# Altium footprint library WR-TBL_Pluggable PCB Header.PcbLib: 719 footprints (part 7 of 45)
Each footprint in its own frame and in the unit in brackets; x right, y up, seen from the top. Pads: shape width x height; smd on the part's side, far side on the other; paste and mask are expansions set on the pad; w line width, h text height; cw(c..) or ccw(c..) is an arc to the next point about the centre after c.
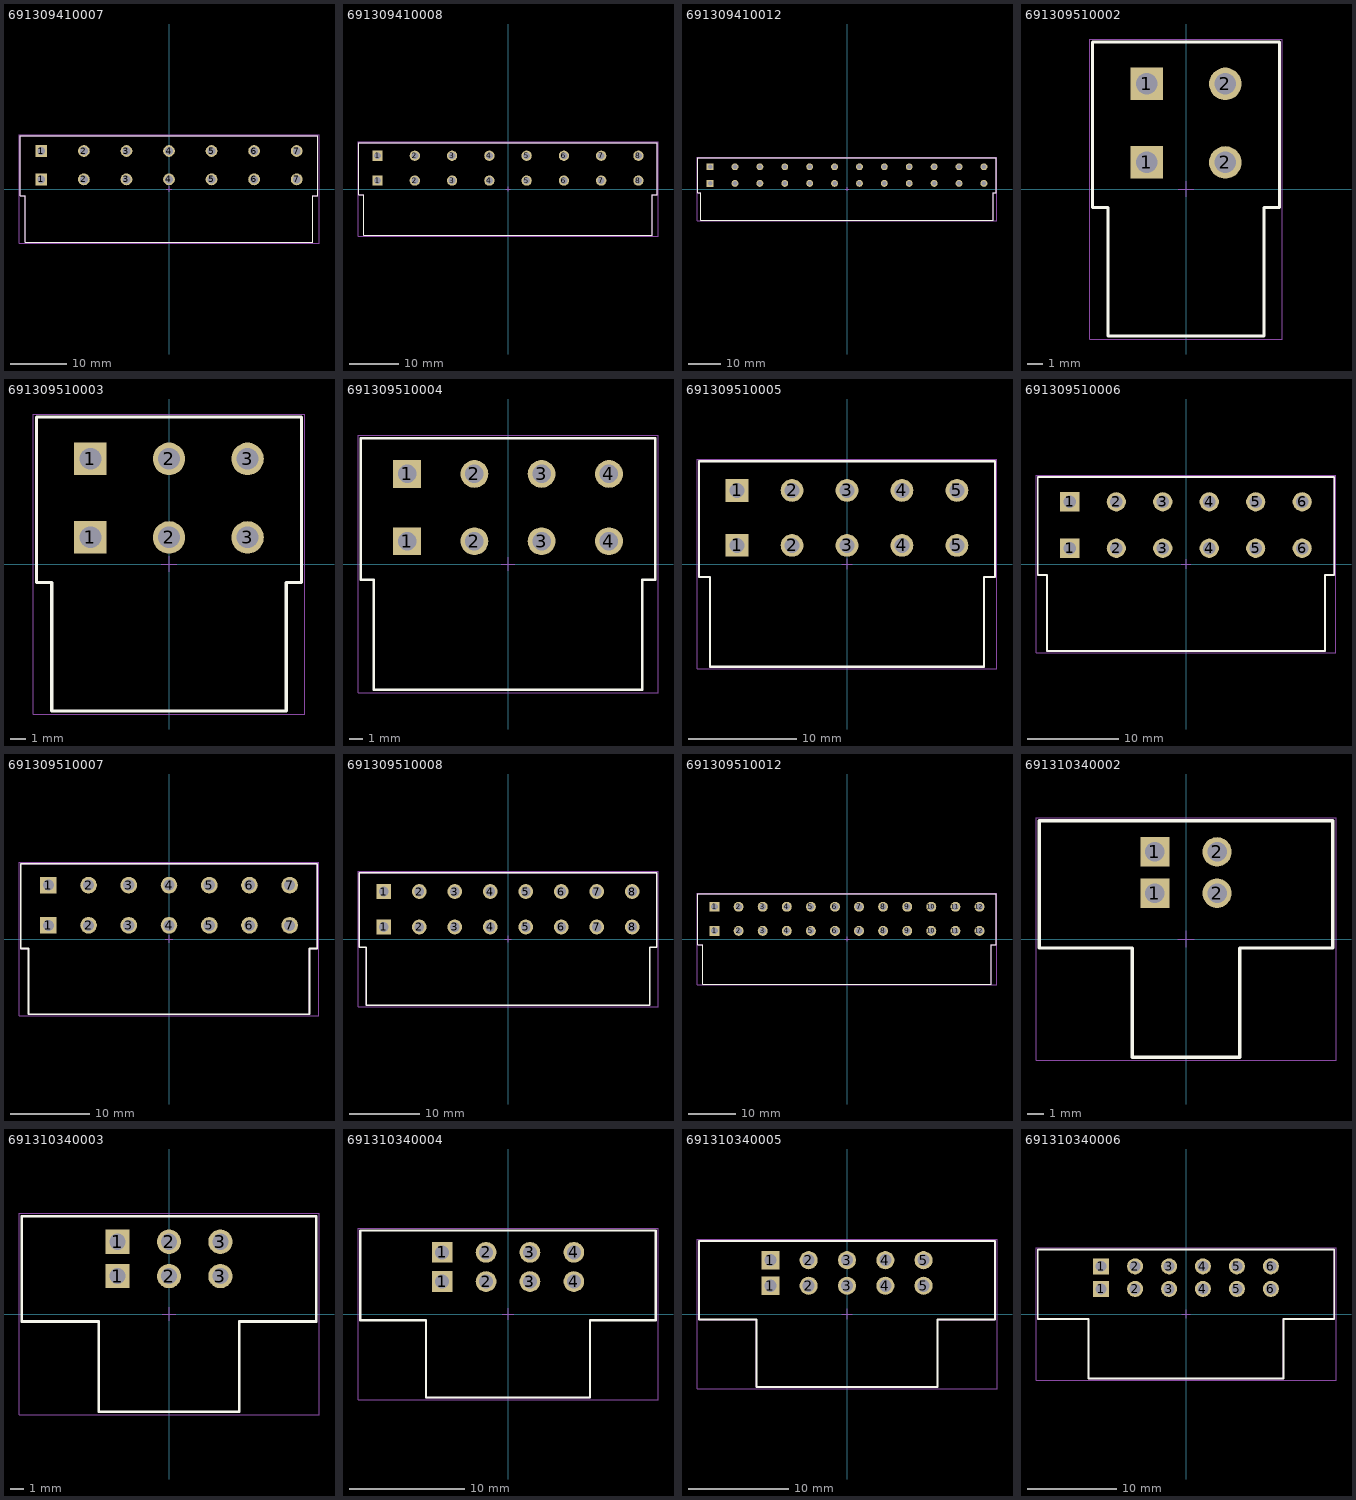
[diagram p6: the footprints below, top view; thin cyan lines are the x and y axes]

## 691309410007 [mm] "7.62 mm - Reversed Gender Horizontal PCB Header - 07p"
height 8.6
pads (14):
  rect 2.1x2.1 hole 1.4: 1(-22.86,1.72) 1(-22.86,6.8)
  round 2.1 hole 1.4: 2(-15.24,1.72) 2(-15.24,6.8) 3(-7.62,1.72) 3(-7.62,6.8) 4(0,1.72) 4(0,6.8) 5(7.62,1.72) 5(7.62,6.8) 6(15.24,1.72) 6(15.24,6.8) 7(22.86,1.72) 7(22.86,6.8)
Top Overlay:
  lines w0.2: -26.66,-1.2 -25.72,-1.2 -25.72,-9.5 25.72,-9.5 25.72,-1.2 26.66,-1.2 26.66,9.5 -26.66,9.5 -26.66,-1.2
Mechanical 13:
  lines w0.1: -26.66,-1.2 -26.66,9.5 26.66,9.5 26.66,-1.2 25.72,-1.2 25.72,-9.5 -25.72,-9.5 -25.72,-1.2 -26.66,-1.2
Mechanical 15:
  lines w0.05: -0.5,0 0.5,0 ; 0,-0.5 0,0.5 ; -26.86,-9.7 26.86,-9.7 26.86,9.7 -26.86,9.7 -26.86,-9.7
3D body "691309410007.stp": height 10.8, standoff -3.45, extent -26.66,-9.5 26.66,9.5

## 691309410008 [mm] "7.62 mm - Reversed Gender Horizontal PCB Header - 08p"
height 8.6
pads (16):
  rect 2.1x2.1 hole 1.4: 1(-26.67,1.72) 1(-26.67,6.8)
  round 2.1 hole 1.4: 2(-19.05,1.72) 2(-19.05,6.8) 3(-11.43,1.72) 3(-11.43,6.8) 4(-3.81,1.72) 4(-3.81,6.8) 5(3.81,1.72) 5(3.81,6.8) 6(11.43,1.72) 6(11.43,6.8) 7(19.05,1.72) 7(19.05,6.8) 8(26.67,1.72) 8(26.67,6.8)
Top Overlay:
  lines w0.2: -30.47,-1.2 -30.47,9.5 30.47,9.5 30.47,-1.2 29.53,-1.2 29.53,-9.5 -29.53,-9.5 -29.53,-1.2 -30.47,-1.2
Mechanical 13:
  lines w0.1: -30.47,-1.2 -29.53,-1.2 -29.53,-9.5 29.53,-9.5 29.53,-1.2 30.47,-1.2 30.47,9.5 -30.47,9.5 -30.47,-1.2
Mechanical 15:
  lines w0.05: -0.5,0 0.5,0 ; 0,-0.5 0,0.5 ; -30.67,-9.7 -30.67,9.7 30.67,9.7 30.67,-9.7 -30.67,-9.7
3D body "691309410008.stp": height 10.8, standoff -3.45, extent -30.47,-9.5 30.47,9.5

## 691309410012 [mm] "7.62 mm - Reversed Gender Horizontal PCB Header - 12p"
height 8.6
pads (24):
  rect 2.1x2.1 hole 1.4: 1(-41.91,1.72) 1(-41.91,6.8)
  round 2.1 hole 1.4: 2(-34.29,1.72) 2(-34.29,6.8) 3(-26.67,1.72) 3(-26.67,6.8) 4(-19.05,1.72) 4(-19.05,6.8) 5(-11.43,1.72) 5(-11.43,6.8) 6(-3.81,1.72) 6(-3.81,6.8) 7(3.81,1.72) 7(3.81,6.8) 8(11.43,1.72) 8(11.43,6.8) 9(19.05,1.72) 9(19.05,6.8) 10(26.67,1.72) 10(26.67,6.8) 11(34.29,1.72) 11(34.29,6.8) 12(41.91,1.72) 12(41.91,6.8)
Top Overlay:
  lines w0.2: -45.71,-1.2 -45.71,9.5 45.71,9.5 45.71,-1.2 44.77,-1.2 44.77,-9.5 -44.77,-9.5 -44.77,-1.2 -45.71,-1.2
Mechanical 13:
  lines w0.1: -45.71,-1.2 -44.77,-1.2 -44.77,-9.5 44.77,-9.5 44.77,-1.2 45.71,-1.2 45.71,9.5 -45.71,9.5 -45.71,-1.2
Mechanical 15:
  lines w0.05: -0.5,0 0.5,0 ; 0,-0.5 0,0.5 ; -45.91,-9.7 -45.91,9.7 45.91,9.7 45.91,-9.7 -45.91,-9.7
3D body "691309410012.stp": height 10.8, standoff -3.45, extent -45.71,-9.5 45.71,9.5

## 691309510002 [mm] "5.08 mm Reversed Gender Horizontal PCB Header - 02p"
height 8.6
pads (4):
  rect 2.1x2.1 hole 1.4: 1(-2.54,1.72) 1(-2.54,6.8)
  round 2.1 hole 1.4: 2(2.54,1.72) 2(2.54,6.8)
Top Overlay:
  lines w0.2: -6.04,-1.2 -5.04,-1.2 -5.04,-9.5 5.04,-9.5 5.04,-1.2 6.04,-1.2 6.04,9.5 -6.04,9.5 -6.04,-1.2
Mechanical 13:
  lines w0.1: -6.04,-1.2 -6.04,9.5 6.04,9.5 6.04,-1.2 5.04,-1.2 5.04,-9.5 -5.04,-9.5 -5.04,-1.2 -6.04,-1.2
Mechanical 15:
  lines w0.05: -0.5,0 0.5,0 ; 0,-0.5 0,0.5 ; -6.24,-9.7 6.24,-9.7 6.24,9.7 -6.24,9.7 -6.24,-9.7
3D body "691309510002.stp": height 10.95, standoff -3.55, extent -6.04,-9.5 6.04,9.5

## 691309510003 [mm] "5.08 mm Reversed Gender Horizontal PCB Header - 03p"
height 8.6
pads (6):
  rect 2.1x2.1 hole 1.4: 1(-5.08,1.72) 1(-5.08,6.8)
  round 2.1 hole 1.4: 2(0,1.72) 2(0,6.8) 3(5.08,1.72) 3(5.08,6.8)
Top Overlay:
  lines w0.2: -8.58,-1.2 -7.58,-1.2 -7.58,-9.5 7.58,-9.5 7.58,-1.2 8.58,-1.2 8.58,9.5 -8.58,9.5 -8.58,-1.2
Mechanical 13:
  lines w0.1: -8.58,-1.2 -8.58,9.5 8.58,9.5 8.58,-1.2 7.58,-1.2 7.58,-9.5 -7.58,-9.5 -7.58,-1.2 -8.58,-1.2
Mechanical 15:
  lines w0.05: -0.5,0 0.5,0 ; 0,-0.5 0,0.5 ; -8.78,-9.7 8.78,-9.7 8.78,9.7 -8.78,9.7 -8.78,-9.7
3D body "691309510003.stp": height 10.95, standoff -3.55, extent -8.58,-9.5 8.58,9.5

## 691309510004 [mm] "5.08 mm Reversed Gender Horizontal PCB Header - 04p"
height 8.6
pads (8):
  rect 2.1x2.1 hole 1.4: 1(-7.62,1.72) 1(-7.62,6.8)
  round 2.1 hole 1.4: 2(-2.54,1.72) 2(-2.54,6.8) 3(2.54,1.72) 3(2.54,6.8) 4(7.62,1.72) 4(7.62,6.8)
Top Overlay:
  lines w0.2: -11.12,-1.2 -10.12,-1.2 -10.12,-9.5 10.12,-9.5 10.12,-1.2 11.12,-1.2 11.12,9.5 -11.12,9.5 -11.12,-1.2
Mechanical 13:
  lines w0.1: -11.12,-1.2 -11.12,9.5 11.12,9.5 11.12,-1.2 10.12,-1.2 10.12,-9.5 -10.12,-9.5 -10.12,-1.2 -11.12,-1.2
Mechanical 15:
  lines w0.05: -0.5,0 0.5,0 ; 0,-0.5 0,0.5 ; -11.32,-9.7 11.32,-9.7 11.32,9.7 -11.32,9.7 -11.32,-9.7
3D body "691309510004.stp": height 10.95, standoff -3.55, extent -11.12,-9.5 11.12,9.5

## 691309510005 [mm] "5.08 mm Reversed Gender Horizontal PCB Header - 05p"
height 8.6
pads (10):
  rect 2.1x2.1 hole 1.4: 1(-10.16,1.72) 1(-10.16,6.8)
  round 2.1 hole 1.4: 2(-5.08,1.72) 2(-5.08,6.8) 3(0,1.72) 3(0,6.8) 4(5.08,1.72) 4(5.08,6.8) 5(10.16,1.72) 5(10.16,6.8)
Top Overlay:
  lines w0.2: -13.66,-1.2 -13.66,9.5 13.66,9.5 13.66,-1.2 12.66,-1.2 12.66,-9.5 -12.66,-9.5 -12.66,-1.2 -13.66,-1.2
Mechanical 13:
  lines w0.1: -13.66,-1.2 -12.66,-1.2 -12.66,-9.5 12.66,-9.5 12.66,-1.2 13.66,-1.2 13.66,9.5 -13.66,9.5 -13.66,-1.2
Mechanical 15:
  lines w0.05: -0.5,0 0.5,0 ; 0,-0.5 0,0.5 ; -13.86,-9.7 -13.86,9.7 13.86,9.7 13.86,-9.7 -13.86,-9.7
3D body "691309510005.stp": height 10.94, standoff -3.55, extent -13.66,-9.5 13.66,9.5

## 691309510006 [mm] "5.08 mm Reversed Gender Horizontal PCB Header - 06p"
height 8.6
pads (12):
  rect 2.1x2.1 hole 1.4: 1(-12.7,1.72) 1(-12.7,6.8)
  round 2.1 hole 1.4: 2(-7.62,1.72) 2(-7.62,6.8) 3(-2.54,1.72) 3(-2.54,6.8) 4(2.54,1.72) 4(2.54,6.8) 5(7.62,1.72) 5(7.62,6.8) 6(12.7,1.72) 6(12.7,6.8)
Top Overlay:
  lines w0.2: -16.2,-1.2 -15.2,-1.2 -15.2,-9.5 15.2,-9.5 15.2,-1.2 16.2,-1.2 16.2,9.5 -16.2,9.5 -16.2,-1.2
Mechanical 13:
  lines w0.1: -16.2,-1.2 -16.2,9.5 16.2,9.5 16.2,-1.2 15.2,-1.2 15.2,-9.5 -15.2,-9.5 -15.2,-1.2 -16.2,-1.2
Mechanical 15:
  lines w0.05: -0.5,0 0.5,0 ; 0,-0.5 0,0.5 ; -16.4,-9.7 16.4,-9.7 16.4,9.7 -16.4,9.7 -16.4,-9.7
3D body "691309510006.stp": height 10.94, standoff -3.55, extent -16.2,-9.5 16.2,9.5

## 691309510007 [mm] "5.08 mm Reversed Gender Horizontal PCB Header - 07p"
height 8.6
pads (14):
  rect 2.1x2.1 hole 1.4: 1(-15.24,1.72) 1(-15.24,6.8)
  round 2.1 hole 1.4: 2(-10.16,1.72) 2(-10.16,6.8) 3(-5.08,1.72) 3(-5.08,6.8) 4(0,1.72) 4(0,6.8) 5(5.08,1.72) 5(5.08,6.8) 6(10.16,1.72) 6(10.16,6.8) 7(15.24,1.72) 7(15.24,6.8)
Top Overlay:
  lines w0.2: -18.74,-1.2 -17.74,-1.2 -17.74,-9.5 17.74,-9.5 17.74,-1.2 18.74,-1.2 18.74,9.5 -18.74,9.5 -18.74,-1.2
Mechanical 13:
  lines w0.1: -18.74,-1.2 -18.74,9.5 18.74,9.5 18.74,-1.2 17.74,-1.2 17.74,-9.5 -17.74,-9.5 -17.74,-1.2 -18.74,-1.2
Mechanical 15:
  lines w0.05: -0.5,0 0.5,0 ; 0,-0.5 0,0.5 ; -18.94,-9.7 18.94,-9.7 18.94,9.7 -18.94,9.7 -18.94,-9.7
3D body "691309510007.stp": height 10.94, standoff -3.55, extent -18.74,-9.5 18.74,9.5

## 691309510008 [mm] "5.08 mm Reversed Gender Horizontal PCB Header - 08p"
height 8.6
pads (16):
  rect 2.1x2.1 hole 1.4: 1(-17.78,1.72) 1(-17.78,6.8)
  round 2.1 hole 1.4: 2(-12.7,1.72) 2(-12.7,6.8) 3(-7.62,1.72) 3(-7.62,6.8) 4(-2.54,1.72) 4(-2.54,6.8) 5(2.54,1.72) 5(2.54,6.8) 6(7.62,1.72) 6(7.62,6.8) 7(12.7,1.72) 7(12.7,6.8) 8(17.78,1.72) 8(17.78,6.8)
Top Overlay:
  lines w0.2: -21.28,-1.2 -21.28,9.5 21.28,9.5 21.28,-1.2 20.28,-1.2 20.28,-9.5 -20.28,-9.5 -20.28,-1.2 -21.28,-1.2
Mechanical 13:
  lines w0.1: -21.28,-1.2 -20.28,-1.2 -20.28,-9.5 20.28,-9.5 20.28,-1.2 21.28,-1.2 21.28,9.5 -21.28,9.5 -21.28,-1.2
Mechanical 15:
  lines w0.05: -0.5,0 0.5,0 ; 0,-0.5 0,0.5 ; -21.48,-9.7 -21.48,9.7 21.48,9.7 21.48,-9.7 -21.48,-9.7
3D body "691309510008.stp": height 10.94, standoff -3.55, extent -21.28,-9.5 21.28,9.5

## 691309510012 [mm] "5.08 mm Reversed Gender Horizontal PCB Header - 12p"
height 8.6
pads (24):
  rect 2.1x2.1 hole 1.4: 1(-27.94,1.72) 1(-27.94,6.8)
  round 2.1 hole 1.4: 2(-22.86,1.72) 2(-22.86,6.8) 3(-17.78,1.72) 3(-17.78,6.8) 4(-12.7,1.72) 4(-12.7,6.8) 5(-7.62,1.72) 5(-7.62,6.8) 6(-2.54,1.72) 6(-2.54,6.8) 7(2.54,1.72) 7(2.54,6.8) 8(7.62,1.72) 8(7.62,6.8) 9(12.7,1.72) 9(12.7,6.8) 10(17.78,1.72) 10(17.78,6.8) 11(22.86,1.72) 11(22.86,6.8) 12(27.94,1.72) 12(27.94,6.8)
Top Overlay:
  lines w0.2: -31.44,-1.2 -30.44,-1.2 -30.44,-9.5 30.44,-9.5 30.44,-1.2 31.44,-1.2 31.44,9.5 -31.44,9.5 -31.44,-1.2
Mechanical 13:
  lines w0.1: -31.44,-1.2 -31.44,9.5 31.44,9.5 31.44,-1.2 30.44,-1.2 30.44,-9.5 -30.44,-9.5 -30.44,-1.2 -31.44,-1.2
Mechanical 15:
  lines w0.05: -0.5,0 0.5,0 ; 0,-0.5 0,0.5 ; -31.64,-9.7 31.64,-9.7 31.64,9.7 -31.64,9.7 -31.64,-9.7
3D body "691309510012.stp": height 10.94, standoff -3.55, extent -31.44,-9.5 31.44,9.5

## 691310340002 [mm] "Horizontal Reversed PCB Header with Flanges, pitch 3.81mm, 02p"
height 6.8
pads (4):
  rect 1.8x1.8 hole 1.2: 1(-1.905,2.81) 1(-1.905,5.35)
  round 1.8 hole 1.2: 2(1.905,2.81) 2(1.905,5.35)
Top Overlay:
  lines w0.2: -9.005,-0.55 -9.005,7.25 9.005,7.25 9.005,-0.55 3.305,-0.55 3.305,-7.25 -3.305,-7.25 -3.305,-0.55 -9.005,-0.55
Mechanical 13:
  lines w0.1: -9.005,-0.55 -3.305,-0.55 -3.305,-7.25 3.305,-7.25 3.305,-0.55 9.005,-0.55 9.005,7.25 -9.005,7.25 -9.005,-0.55
Mechanical 15:
  lines w0.05: -0.5,0 0.5,0 ; 0,-0.5 0,0.5 ; -9.205,-7.45 -9.205,7.45 9.205,7.45 9.205,-7.45 -9.205,-7.45
3D body "691310340002.stp": height 6.85, standoff -3.35, extent -9.005,-7.25 9.005,7.25

## 691310340003 [mm] "Horizontal Reversed PCB Header with Flanges, pitch 3.81mm, 03p"
height 6.8
pads (6):
  rect 1.8x1.8 hole 1.2: 1(-3.81,2.81) 1(-3.81,5.35)
  round 1.8 hole 1.2: 2(0,2.81) 2(0,5.35) 3(3.81,2.81) 3(3.81,5.35)
Top Overlay:
  lines w0.2: -10.91,-0.55 -10.91,7.25 10.91,7.25 10.91,-0.55 5.21,-0.55 5.21,-7.25 -5.21,-7.25 -5.21,-0.55 -10.91,-0.55
Mechanical 13:
  lines w0.1: -10.91,-0.55 -5.21,-0.55 -5.21,-7.25 5.21,-7.25 5.21,-0.55 10.91,-0.55 10.91,7.25 -10.91,7.25 -10.91,-0.55
Mechanical 15:
  lines w0.05: -0.5,0 0.5,0 ; 0,-0.5 0,0.5 ; -11.11,-7.45 -11.11,7.45 11.11,7.45 11.11,-7.45 -11.11,-7.45
3D body "691310340003.stp": height 6.85, standoff -3.35, extent -10.91,-7.25 10.91,7.25

## 691310340004 [mm] "Horizontal Reversed PCB Header with Flanges, pitch 3.81mm, 04p"
height 6.8
pads (8):
  rect 1.8x1.8 hole 1.2: 1(-5.715,2.81) 1(-5.715,5.35)
  round 1.8 hole 1.2: 2(-1.905,2.81) 2(-1.905,5.35) 3(1.905,2.81) 3(1.905,5.35) 4(5.715,2.81) 4(5.715,5.35)
Top Overlay:
  lines w0.2: -12.815,-0.55 -12.815,7.25 12.815,7.25 12.815,-0.55 7.115,-0.55 7.115,-7.25 -7.115,-7.25 -7.115,-0.55 -12.815,-0.55
Mechanical 13:
  lines w0.1: -12.815,-0.55 -7.115,-0.55 -7.115,-7.25 7.115,-7.25 7.115,-0.55 12.815,-0.55 12.815,7.25 -12.815,7.25 -12.815,-0.55
Mechanical 15:
  lines w0.05: -0.5,0 0.5,0 ; 0,-0.5 0,0.5 ; -13.015,-7.45 -13.015,7.45 13.015,7.45 13.015,-7.45 -13.015,-7.45
3D body "691310340004.stp": height 6.85, standoff -3.35, extent -12.815,-7.25 12.815,7.25

## 691310340005 [mm] "Horizontal Reversed PCB Header with Flanges, pitch 3.81mm, 05p"
height 6.8
pads (10):
  rect 1.8x1.8 hole 1.2: 1(-7.62,2.81) 1(-7.62,5.35)
  round 1.8 hole 1.2: 2(-3.81,2.81) 2(-3.81,5.35) 3(0,2.81) 3(0,5.35) 4(3.81,2.81) 4(3.81,5.35) 5(7.62,2.81) 5(7.62,5.35)
Top Overlay:
  lines w0.2: -14.72,-0.55 -9.02,-0.55 -9.02,-7.25 9.02,-7.25 9.02,-0.55 14.72,-0.55 14.72,7.25 -14.72,7.25 -14.72,-0.55
Mechanical 13:
  lines w0.1: -14.72,-0.55 -14.72,7.25 14.72,7.25 14.72,-0.55 9.02,-0.55 9.02,-7.25 -9.02,-7.25 -9.02,-0.55 -14.72,-0.55
Mechanical 15:
  lines w0.05: -0.5,0 0.5,0 ; 0,-0.5 0,0.5 ; -14.92,-7.45 14.92,-7.45 14.92,7.45 -14.92,7.45 -14.92,-7.45
3D body "691310340005.stp": height 6.85, standoff -3.35, extent -14.72,-7.25 14.72,7.25

## 691310340006 [mm] "Horizontal Reversed PCB Header with Flanges, pitch 3.81mm, 06p"
height 6.8
pads (12):
  rect 1.8x1.8 hole 1.2: 1(-9.525,2.81) 1(-9.525,5.35)
  round 1.8 hole 1.2: 2(-5.715,2.81) 2(-5.715,5.35) 3(-1.905,2.81) 3(-1.905,5.35) 4(1.905,2.81) 4(1.905,5.35) 5(5.715,2.81) 5(5.715,5.35) 6(9.525,2.81) 6(9.525,5.35)
Top Overlay:
  lines w0.2: -16.625,-0.55 -16.625,7.25 16.625,7.25 16.625,-0.55 10.925,-0.55 10.925,-7.25 -10.925,-7.25 -10.925,-0.55 -16.625,-0.55
Mechanical 13:
  lines w0.1: -16.625,-0.55 -10.925,-0.55 -10.925,-7.25 10.925,-7.25 10.925,-0.55 16.625,-0.55 16.625,7.25 -16.625,7.25 -16.625,-0.55
Mechanical 15:
  lines w0.05: -0.5,0 0.5,0 ; 0,-0.5 0,0.5 ; -16.825,-7.45 -16.825,7.45 16.825,7.45 16.825,-7.45 -16.825,-7.45
3D body "691310340006.stp": height 6.85, standoff -3.35, extent -16.625,-7.25 16.625,7.25